# Altium footprint library 10-Diobe.PcbLib: 108 footprints (part 2 of 7)
Each footprint in its own frame and in the unit in brackets; x right, y up, seen from the top. Pads: shape width x height; smd on the part's side, far side on the other; paste and mask are expansions set on the pad; w line width, h text height; cw(c..) or ccw(c..) is an arc to the next point about the centre after c.
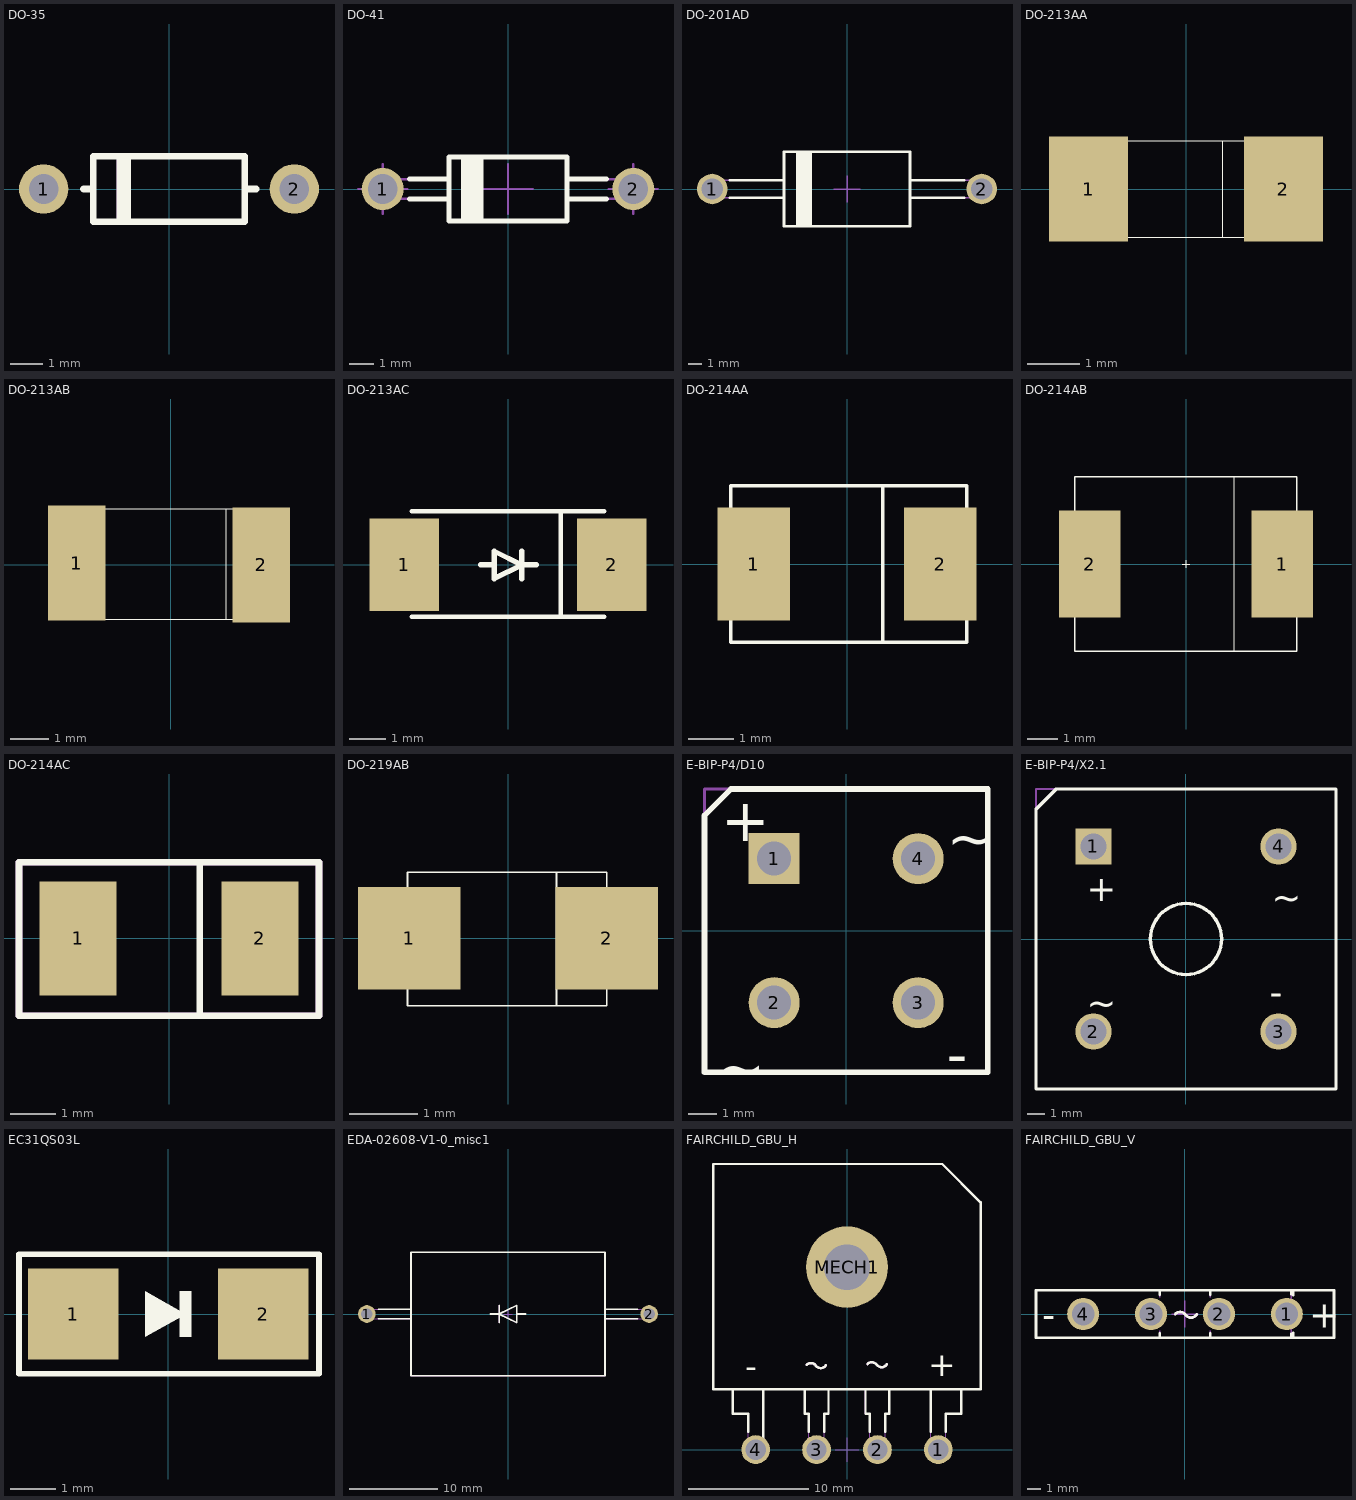
[diagram p1: the footprints below, top view; thin cyan lines are the x and y axes]

## DO-35 [mm] "Diode, Axial, Body 4.6 x 2 mm (LxDia. max), Pin spacing 7.62mm"
height 2
pads (2):
  round 1.5 hole 0.9: 1(-3.81,0) 2(3.81,0)
Top Overlay:
  lines w0.2: -2.6,0 -2.35,0 ; -1.499,-1 -1.499,0.999 ; -1.45,-1 -1.45,0.999 ; -1.401,-1 -1.401,0.999 ; -1.352,-1 -1.352,0.999 ; -1.303,-1 -1.303,0.999 ; -1.254,-1 -1.254,0.999 ; 2.4,0 2.65,0 ; -2.298,-1 2.3,-1 2.3,1 -2.298,1 -2.298,-1
Mechanical 14:
  lines w0.1: -2.6,0 -2.35,0 ; -1.55,-1 -1.55,1 ; -1.501,-1 -1.501,1 ; -1.499,-1 -1.499,1 ; -1.452,-1 -1.452,1 ; -1.403,-1 -1.403,1 ; -1.354,-1 -1.354,1 ; -1.305,-1 -1.305,1 ; -1.205,-1 -1.205,1 ; 2.35,0 2.6,0 ; -2.3,-1 -2.3,1 2.3,1 2.3,-1 -2.3,-1 ; -1.45,-1 -1.45,1 -1.45,-1 ; -1.401,-1 -1.401,1 -1.401,-1 ; -1.352,-1 -1.352,1 -1.352,-1 ; -1.303,-1 -1.303,1 -1.303,-1 ; -1.254,-1 -1.254,1 -1.254,-1
3D body "v150-090.stp": height 0.02, standoff -1.65, extent 3.06,-0.75 4.56,0.75
3D body "v150-090.stp": height 0.02, standoff -1.65, extent -4.56,-0.75 -3.06,0.75
3D body "DO-35.stp": height 1.91, standoff -3, extent -4.076,-0.955 4.077,0.955

## DO-41 [mm] "DO-41, Diode, Axial, Body 4.7 x 2.7 mm (LxDia. max), Pin spacing 10.16mm"
height 2.8
pads (2):
  round 1.7 hole 1.2: 1(-5.08,0) 2(5.08,0)
Top Overlay:
  lines w0.2: -4.002,-0.4 -2.4,-0.4 ; -4.002,0.4 -2.4,0.4 ; -1.8,-1.3 -1.8,1.3 ; -1.7,-1.3 -1.7,1.3 ; -1.6,-1.3 -1.6,1.3 ; -1.5,-1.3 -1.5,1.3 ; -1.4,-1.3 -1.4,1.3 ; -1.3,-1.3 -1.3,1.3 ; -1.2,-1.3 -1.2,1.3 ; -1.1,-1.3 -1.1,1.3 ; 2.4,-0.4 4.002,-0.4 ; 2.4,0.4 4.002,0.4 ; -2.4,-1.3 -2.4,1.3 2.4,1.3 2.4,-1.3 -2.4,-1.3
Mechanical 8:
  lines w0.1: -6.08,0 -5.08,0 ; -5.08,-1 -5.08,0 ; -5.08,1 -5.08,0 ; -4.08,0 -5.08,0 ; -1,0 0,0 ; 0,-1 0,0 ; 0,1 0,0 ; 1,0 0,0 ; 4.08,0 5.08,0 ; 5.08,-1 5.08,0 ; 5.08,1 5.08,0 ; 6.08,0 5.08,0
Mechanical 14:
  lines w0.1: -2.4,-0.4 -5.08,-0.4 cw(c-5.08,0) -5.08,0.4 -2.4,0.4 ; -1.8,-1.3 -1.8,1.3 ; -1.7,-1.3 -1.7,1.3 ; -1.6,-1.3 -1.6,1.3 ; -1.5,-1.3 -1.5,1.3 ; -1.4,-1.3 -1.4,1.3 ; -1.3,-1.3 -1.3,1.3 ; -1.2,-1.3 -1.2,1.3 ; -1.1,-1.3 -1.1,1.3 ; 2.4,-0.4 5.08,-0.4 ccw(c5.08,0) 5.08,0.4 2.4,0.4 ; -2.4,-1.3 2.4,-1.3 2.4,1.3 -2.4,1.3 -2.4,-1.3
3D body "DO-41.stp": height 2.6, standoff -3.2, extent -5.48,-1.3 5.48,1.3
3D body "v160-110.stp": height 0.02, standoff -1.65, extent -5.88,-0.8 -4.28,0.8
3D body "v160-110.stp": height 0.02, standoff -1.65, extent 4.28,-0.8 5.88,0.8

## DO-201AD [mm] "DO-201AD, Diode, Axial; Lead Spacing 20.32mm, Lead Dia. 1.3mm, Body Length 9.5mm, Body Dia. 5.6mm"
height 5.6
pads (2):
  round 2.3 hole 1.6: 1(-10.16,0) 2(10.16,0)
Top Overlay:
  lines w0.2: -8.85,-0.65 -4.75,-0.65 ; -8.85,0.65 -4.75,0.65 ; -3.75,-2.8 -3.75,2.8 ; -3.55,-2.8 -3.55,2.8 ; -3.35,-2.8 -3.35,2.8 ; -3.15,-2.8 -3.15,2.8 ; -2.95,-2.8 -2.95,2.8 ; -2.75,-2.8 -2.75,2.8 ; 4.75,-0.65 8.85,-0.65 ; 4.75,0.65 8.85,0.65 ; -4.75,-2.8 -4.75,2.8 4.75,2.8 4.75,-2.8 -4.75,-2.8
Mechanical 8:
  lines w0.1: -11.16,0 -10.16,0 ; -10.16,-1 -10.16,0 ; -10.16,1 -10.16,0 ; -9.16,0 -10.16,0 ; -1,0 0,0 ; 0,-1 0,0 ; 0,1 0,0 ; 1,0 0,0 ; 9.16,0 10.16,0 ; 10.16,-1 10.16,0 ; 10.16,1 10.16,0 ; 11.16,0 10.16,0
Mechanical 14:
  lines w0.1: -4.75,-0.65 -10.16,-0.65 cw(c-10.16,0) -10.16,0.65 -4.75,0.65 ; -3.75,-2.8 -3.75,2.8 ; -3.55,-2.8 -3.55,2.8 ; -3.35,-2.8 -3.35,2.8 ; -3.15,-2.8 -3.15,2.8 ; -2.95,-2.8 -2.95,2.8 ; -2.75,-2.8 -2.75,2.8 ; 4.75,-0.65 10.16,-0.65 ccw(c10.16,0) 10.16,0.65 4.75,0.65 ; -4.75,-2.8 -4.75,2.8 4.75,2.8 4.75,-2.8 -4.75,-2.8
3D body "v220-150.stp": height 0.02, standoff -1.65, extent 9.06,-1.1 11.26,1.1
3D body "v220-150.stp": height 0.02, standoff -1.65, extent -11.26,-1.1 -9.06,1.1
3D body "DO-201AD.stp": height 5.6, standoff -3.8, extent -10.81,-2.8 10.81,2.8

## DO-213AA [mm]
height 5.6
pads (2):
  rect 1.5x2 smd mask+0.051: 1(-1.855,0) 2(1.855,0)
Top Overlay:
  lines w0.005: 0.699,-0.914 0.699,0.914 ; -1.88,-0.914 -1.88,0.914 1.829,0.914 1.829,-0.914 -1.88,-0.914
3D body "p200-150.stp": height 0.02, standoff 0, extent -2.567,-1 -1.067,1
3D body "p200-150.stp": height 0.02, standoff 0, extent 1.143,-1 2.643,1
3D body "do-213aa.stp": height 1.64, standoff -0.04, extent -1.775,-0.814 1.724,0.863

## DO-213AB [mm]
height 5.6
pads (2):
  rect 1.5x3 smd mask+0.051: 1(-2.464,0.051) 2(2.362,0)
Top Overlay:
  lines w0.005: 1.448,-1.422 1.448,1.473 ; -2.642,-1.422 -2.642,1.473 2.642,1.473 2.642,-1.422 -2.642,-1.422
3D body "do-213ab.stp": height 2.76, standoff -0.05, extent -2.6,-1.385 2.6,1.422
3D body "p300-150.stp": height 0.02, standoff 0, extent -3.214,-1.449 -1.714,1.551
3D body "p300-150.stp": height 0.02, standoff 0, extent 1.548,-1.551 3.048,1.449

## DO-213AC [mm]
height 5.6
pads (2):
  rect 1.9x2.54 smd mask+0.051: 1(-2.85,0) 2(2.85,0)
Top Overlay:
  lines w0.127: -2.642,-1.422 2.642,-1.422 ; -2.642,1.473 2.642,1.473 ; 1.448,-1.422 1.448,1.473
  lines w0.15: -0.75,0 -0.375,0 ; 0.375,-0.375 0.375,0.375 ; 0.775,0 0.375,0 ; 0.375,0 -0.375,-0.375 -0.375,0.375 0.375,0
3D body "sma_do-214ac.stp": height 2, standoff 0, extent -2.199,-1.145 2.199,1.145
3D body "do213acpad.stp": height 0.01, standoff 0, extent -3.795,-1.27 -1.895,1.27
3D body "do213acpad.stp": height 0.01, standoff 0, extent 1.895,-1.27 3.795,1.27

## DO-214AA [mm]
height 5.6
pads (2):
  rect 1.6x2.5 smd mask+0.051: 1(-2.06,0) 2(2.06,0)
Top Overlay:
  lines w0.076: 0.787,-1.727 0.787,1.727 ; -2.565,-1.727 -2.565,1.727 2.642,1.727 2.642,-1.727 -2.565,-1.727
3D body "smb_do-214aa.stp": height 2, standoff 0, extent -2.489,-1.651 2.545,1.649
3D body "p250-160.stp": height 0.02, standoff 0, extent -2.87,-1.25 -1.27,1.25
3D body "p250-160.stp": height 0.02, standoff 0, extent 1.27,-1.25 2.87,1.25

## DO-214AB [mm]
height 5.6
pads (2):
  rect 2x3.5 smd mask+0.051: 1(3.14,0) 2(-3.14,0)
Top Overlay:
  lines w0.005: -0.127,0 0.127,0 ; 0,-0.127 0,0.127
  lines w0.025: 1.577,-2.809 1.577,2.819
  lines w0.051: -3.632,-2.845 3.607,-2.845 3.607,2.845 -3.632,2.845 -3.632,-2.845
3D body "smc_do-214ab.stp": height 2, standoff 0, extent -3.558,-2.795 3.556,2.795
3D body "p350-250.stp": height 0.02, standoff 0, extent -4.175,-1.75 -2.175,1.75
3D body "p350-250.stp": height 0.02, standoff 0, extent 2.175,-1.75 4.175,1.75

## DO-214AC [mm]
height 5.6
pads (2):
  rect 1.7x2.5 smd: 1(-2,0) 2(2,0)
Top Overlay:
  lines w0.15: 0.675,-1.7 0.675,1.65 ; -3.3,-1.7 3.3,-1.7 3.3,1.675 -3.3,1.675 -3.3,-1.7
Mechanical 14:
  lines w0.15: -3.3,-1.7 3.3,-1.7 3.3,1.675 -3.3,1.675 -3.3,-1.7
Mechanical 15:
  lines w0.15: -3.3,-1.7 3.3,-1.7 3.3,1.675 -3.3,1.675 -3.3,-1.7
3D body "do214acpad.stp": height 0.01, standoff 0.01, extent -2.85,-1.25 -1.15,1.25
3D body "do214acpad.stp": height 0.01, standoff 0.01, extent 1.15,-1.25 2.85,1.25
3D body "do214ac.stp": height 1.9, standoff 0.03, extent -2.485,-1.2 2.485,1.2

## DO-219AB [mm]
height 5.6
pads (2):
  rect 1.5x1.5 smd mask+0.051: 1(-1.45,0) 2(1.45,0)
Top Overlay:
  lines w0.025: 0.711,-0.991 0.711,0.965 ; -1.473,-0.991 -1.473,0.965 1.448,0.965 1.448,-0.991 -1.473,-0.991
3D body "do-219ab.stp": height 1.08, standoff 0, extent -1.981,-0.965 1.919,0.935
3D body "p150-150.stp": height 0.02, standoff 0, extent -2.2,-0.75 -0.7,0.75
3D body "p150-150.stp": height 0.02, standoff 0, extent 0.7,-0.75 2.2,0.75

## E-BIP-P4/D10 [mm] "Bridge Rectifier; 4 Terminals; Body 9.4 x 9.4 mm (typ); Pitch 5.08 mm"
height 9.91
pads (4):
  rect 1.8x1.8 hole 1.2 mask+0.07: 1(-2.54,2.54)
  round 1.8 hole 1.2: 2(-2.54,-2.54)
  round 1.8 hole 1.2 mask+0.07: 3(2.54,-2.54) 4(2.54,2.54)
Top Overlay:
  lines w0.2: -5,-5 5,-5 5,5 -4.064,5 -5,4.064 -5,-5
  text "~" at 3.556,2.54 h1.5
  text "~" at -4.572,-5.588 h1.5
  text "-" at 3.556,-5.08 h1.5
  text "+" at -4.41,3.164 h1.5
Mechanical 13:
  lines w0.1: -5,-5 5,-5 5,5 -5,5 -5,-5
3D body "v220-150.stp": height 0.02, standoff -1.65, extent -3.64,1.44 -1.44,3.64
3D body "v220-150.stp": height 0.02, standoff -1.65, extent 1.44,1.44 3.64,3.64
3D body "v220-150.stp": height 0.02, standoff -1.65, extent -3.64,-3.64 -1.44,-1.44
3D body "v220-150.stp": height 0.02, standoff -1.65, extent 1.44,-3.64 3.64,-1.44

## E-BIP-P4/X2.1 [mm] "Bridge Rectifier; 4 Terminals; Body 16.8 x 16.8 mm (typ); Pitch 10.67 mm"
height 6.35
pads (4):
  rect 2.1x2.1 hole 1.5 mask+0.07: 1(-5.335,5.335)
  round 2.1 hole 1.5: 2(-5.335,-5.335)
  round 2.1 hole 1.5 mask+0.07: 3(5.335,-5.335) 4(5.335,5.335)
Top Overlay:
  circle w0.2: c0,0 r2.05
  lines w0.2: -8.65,-8.65 -8.65,7.474 -7.474,8.65 8.65,8.65 8.65,-8.65 -8.65,-8.65
  text "+" at -5.723,2.167 h1.5
  text "-" at 4.825,-3.809 h1.5
  text "~" at 4.945,1.659 h1.5
  text "~" at -5.723,-4.437 h1.5
Mechanical 13:
  lines w0.1: -8.65,-8.65 8.65,-8.65 8.65,8.65 -8.65,8.65 -8.65,-8.65
3D body "v220-150.stp": height 0.02, standoff -1.65, extent -6.435,4.235 -4.235,6.435
3D body "v220-150.stp": height 0.02, standoff -1.65, extent 4.235,4.235 6.435,6.435
3D body "v220-150.stp": height 0.02, standoff -1.65, extent -6.435,-6.435 -4.235,-4.235
3D body "v220-150.stp": height 0.02, standoff -1.65, extent 4.235,-6.435 6.435,-4.235

## EC31QS03L [mm]
height 6.35
pads (2):
  rect 2x2 smd mask+0.102: 1(-2.1,0) 2(2.1,0)
Top Overlay:
  region: -0.508,0.508 0.381,0 -0.508,-0.508
  region: 0.254,0.508 0.508,0.508 0.508,-0.508 0.254,-0.508
  lines w0.127: -3.302,-1.321 -3.302,1.321 3.327,1.321 3.327,-1.321 -3.302,-1.321
3D body "2_2-1_6-ms73.stp": height 0.02, standoff 0, extent -3.111,-1.1 -1.511,1.1
3D body "2_2-1_6-ms73.stp": height 0.02, standoff 0, extent 1.511,-1.1 3.111,1.1
3D body "ec31qs03l.stp": height 2, standoff -0.02, extent -2.549,-1.25 2.549,1.25

## EDA-02608-V1-0_misc1 [mm] "Diode Molded in ABS Box, Lead Spacing 28mm, Body L 22mm X W 14mm x H 12mm"
height 5.46
pads (2):
  round 2 hole 1.3: 1(-16,0) 2(16,0)
Top Overlay:
  lines w0.2: -14.713,-0.55 -11,-0.55 ; -14.713,0.55 -11,0.55 ; -2,0 -1,0 ; -1,-1 -1,1 ; 1,0 2,0 ; 11,-0.546 14.712,-0.549 ; 11,0.549 14.712,0.55 ; -1,0 1,-1 1,1 -1,0 ; -11,-7 11,-7 11,7 -11,7 -11,-7
Mechanical 8:
  lines w0.1: -16.5,0 -16,0 ; -16,-0.5 -16,0 ; -16,0.5 -16,0 ; -15.5,0 -16,0 ; -0.5,0 0,0 ; 0,-0.5 0,0 ; 0,0.5 0,0 ; 0.5,0 0,0 ; 15.5,0 16,0 ; 16,-0.5 16,0 ; 16,0.5 16,0 ; 16.5,0 16,0
Mechanical 14:
  lines w0.1: -11,-0.55 -16,-0.55 cw(c-16,0) -16,0.55 -11,0.55 ; -2,0 -1,0 ; -1,-1 -1,1 ; 1,0 2,0 ; 11,-0.546 16,-0.55 ccw(c16,0) 16,0.55 11,0.549 ; -1,0 1,1 1,-1 -1,0 ; -11,-7 11,-7 11,7 -11,7 -11,-7
3D body "v220-150.stp": height 0.02, standoff -1.65, extent 14.9,-1.1 17.1,1.1
3D body "v220-150.stp": height 0.02, standoff -1.65, extent -17.1,-1.1 -14.9,1.1
3D body "EDA-02608-V1-0_misc1.stp": height 12.05, standoff -3.6, extent -16.55,-7 16.55,7

## FAIRCHILD_GBU_H [mm] "Glass Passivated Single-Phase Bridge Rectifier, Body 22.3mm x 18.8mm"
height 3.56
pads (5):
  round 2.4 hole 1.7: 1(7.62,0) 2(2.54,0) 3(-2.54,0) 4(-7.62,0)
  round 6.8 hole 3.8: MECH1(0,15.23)
Top Overlay:
  lines w0.2: -9.525,5.03 -9.525,3 -8.255,3 -8.255,1.5 ; -6.985,0.898 -6.985,5.03 ; -3.54,5.03 -3.54,3 -3.175,3 -3.175,1.5 ; -3.37,7.068 cw(c-3.01,6.721) -2.595,7 ; -2.57,6.98 ccw(c-2.189,7.304) -1.76,7.046 ; -1.905,1.5 -1.905,3 -1.54,3 -1.54,5.03 ; 1.54,5.03 1.54,3 1.905,3 1.905,1.5 ; 1.71,7.136 cw(c2.07,6.79) 2.485,7.068 ; 2.51,7.048 ccw(c2.891,7.372) 3.32,7.115 ; 3.175,1.5 3.175,3 3.54,3 3.54,5.03 ; 6.985,1.5 6.985,5.03 ; 8.255,1.5 8.255,3 9.525,3 9.525,5.03 ; -11.15,5.03 11.15,5.03 11.15,20.63 7.95,23.83 -11.15,23.83 -11.15,5.03
  text "+" at 6.77,6.12 h2
  text "-" at -8.5,6 h2
Mechanical 8:
  lines w0.1: -8.62,0 -7.62,0 ; -7.62,-1 -7.62,0 ; -7.62,1 -7.62,0 ; -6.62,0 -7.62,0 ; -3.54,0 -2.54,0 ; -2.54,-1 -2.54,0 ; -2.54,1 -2.54,0 ; -1.54,0 -2.54,0 ; -1,0 0,0 ; -1,15.23 0,15.23 ; 0,-1 0,0 ; 0,1 0,0 ; 0,14.23 0,15.23 ; 0,16.23 0,15.23 ; 1,0 0,0 ; 1,15.23 0,15.23 ; 1.54,0 2.54,0 ; 2.54,-1 2.54,0 ; 2.54,1 2.54,0 ; 3.54,0 2.54,0 ; 6.62,0 7.62,0 ; 7.62,-1 7.62,0 ; 7.62,1 7.62,0 ; 8.62,0 7.62,0
Mechanical 14:
  lines w0.1: -9.525,5.03 -9.525,3 -8.255,3 -8.255,-0.28 -6.985,-0.28 -6.985,5.03 ; -3.54,5.03 -3.54,3 -3.175,3 -3.175,-0.28 -1.905,-0.28 -1.905,3 -1.54,3 -1.54,5.03 ; 1.54,5.03 1.54,3 1.905,3 1.905,-0.28 3.175,-0.28 3.175,3 3.54,3 3.54,5.03 ; 6.985,5.03 6.985,-0.28 8.255,-0.28 8.255,3 9.525,3 9.525,5.03 ; -11.15,5.03 11.15,5.03 11.15,20.63 7.95,23.83 -11.15,23.83 -11.15,5.03 ; -1.9,14.28 ccw(c0,14.28) 1.9,14.28 1.9,16.18 ccw(c0,16.18) -1.9,16.18 -1.9,14.28
  lines w0.2: -3.37,7.068 cw(c-3.01,6.721) -2.595,7 ; -2.57,6.98 ccw(c-2.189,7.304) -1.76,7.046 ; 1.71,7.136 cw(c2.07,6.79) 2.485,7.068 ; 2.51,7.048 ccw(c2.891,7.372) 3.32,7.115
  text "+" at 6.77,6.12 h2
  text "-" at -8.5,6 h2
3D body "FAIRCHILD_GBU-H.stp": height 3.56, standoff -3.6, extent -11.15,-0.28 11.15,23.83
3D body "v280-170.stp": height 0.02, standoff -1.65, extent -9.02,-1.4 -6.22,1.4
3D body "v280-170.stp": height 0.02, standoff -1.65, extent -3.94,-1.4 -1.14,1.4
3D body "v280-170.stp": height 0.02, standoff -1.65, extent 1.14,-1.4 3.94,1.4
3D body "v280-170.stp": height 0.02, standoff -1.65, extent 6.22,-1.4 9.02,1.4

## FAIRCHILD_GBU_V [mm] "Glass Passivated Single-Phase Bridge Rectifier, Body 22.3mm x 3.56mm"
height 20.83
pads (4):
  round 2.4 hole 1.7: 1(7.62,0) 2(2.54,0) 3(-2.54,0) 4(-7.62,0)
Top Overlay:
  lines w0.2: -1.9,-1.78 -1.9,-1.45 ; -1.9,1.45 -1.9,1.78 ; -0.73,-0.007 cw(c-0.37,-0.354) 0.045,-0.075 ; 0.07,-0.095 ccw(c0.451,0.229) 0.88,-0.029 ; 1.9,-1.78 1.9,-1.45 ; 1.9,1.45 1.9,1.78 ; 7.95,-1.78 7.95,-1.5 ; 7.95,1.5 7.95,1.78 ; 8.1,-1.78 8.1,-1.425 ; 8.1,1.425 8.1,1.78 ; -11.15,-1.78 -11.15,1.78 11.15,1.78 11.15,-1.78 -11.15,-1.78
  text "-" at -10.675,-1.025 h2
  text "+" at 9.3,-1.03 h2
Mechanical 8:
  lines w0.1: -8.62,0 -7.62,0 ; -7.62,-1 -7.62,0 ; -7.62,1 -7.62,0 ; -6.62,0 -7.62,0 ; -3.54,0 -2.54,0 ; -2.54,-1 -2.54,0 ; -2.54,1 -2.54,0 ; -1.54,0 -2.54,0 ; -1,0 0,0 ; 0,-1 0,0 ; 0,1 0,0 ; 1,0 0,0 ; 1.54,0 2.54,0 ; 2.54,-1 2.54,0 ; 2.54,1 2.54,0 ; 3.54,0 2.54,0 ; 6.62,0 7.62,0 ; 7.62,-1 7.62,0 ; 7.62,1 7.62,0 ; 8.62,0 7.62,0
Mechanical 14:
  lines w0.1: -1.9,-1.78 -1.9,-1.272 ; -1.9,-0.764 -1.9,-0.256 ; -1.9,0.252 -1.9,0.76 ; -1.9,1.268 -1.9,1.78 ; 1.9,-1.78 1.9,-1.272 ; 1.9,-0.764 1.9,-0.256 ; 1.9,0.252 1.9,0.76 ; 1.9,1.268 1.9,1.78 ; 7.95,-1.78 7.95,1.78 ; -11.15,-1.78 -11.15,1.78 11.15,1.78 11.15,-1.78 -11.15,-1.78
  lines w0.2: -0.73,-0.007 cw(c-0.37,-0.354) 0.045,-0.075 ; 0.07,-0.095 ccw(c0.451,0.229) 0.88,-0.029
  text "-" at -10.675,-1.025 h2
  text "+" at 9.3,-1.03 h2
3D body "FAIRCHILD_GBU-V.stp": height 20.83, standoff -3.8, extent -11.15,-1.78 11.15,1.78